# Altium footprint library PFC_Stage.PcbLib: 60 footprints (part 1 of 4)
Each footprint in its own frame and in the unit in brackets; x right, y up, seen from the top. Pads: shape width x height; smd on the part's side, far side on the other; paste and mask are expansions set on the pad; w line width, h text height; cw(c..) or ccw(c..) is an arc to the next point about the centre after c.
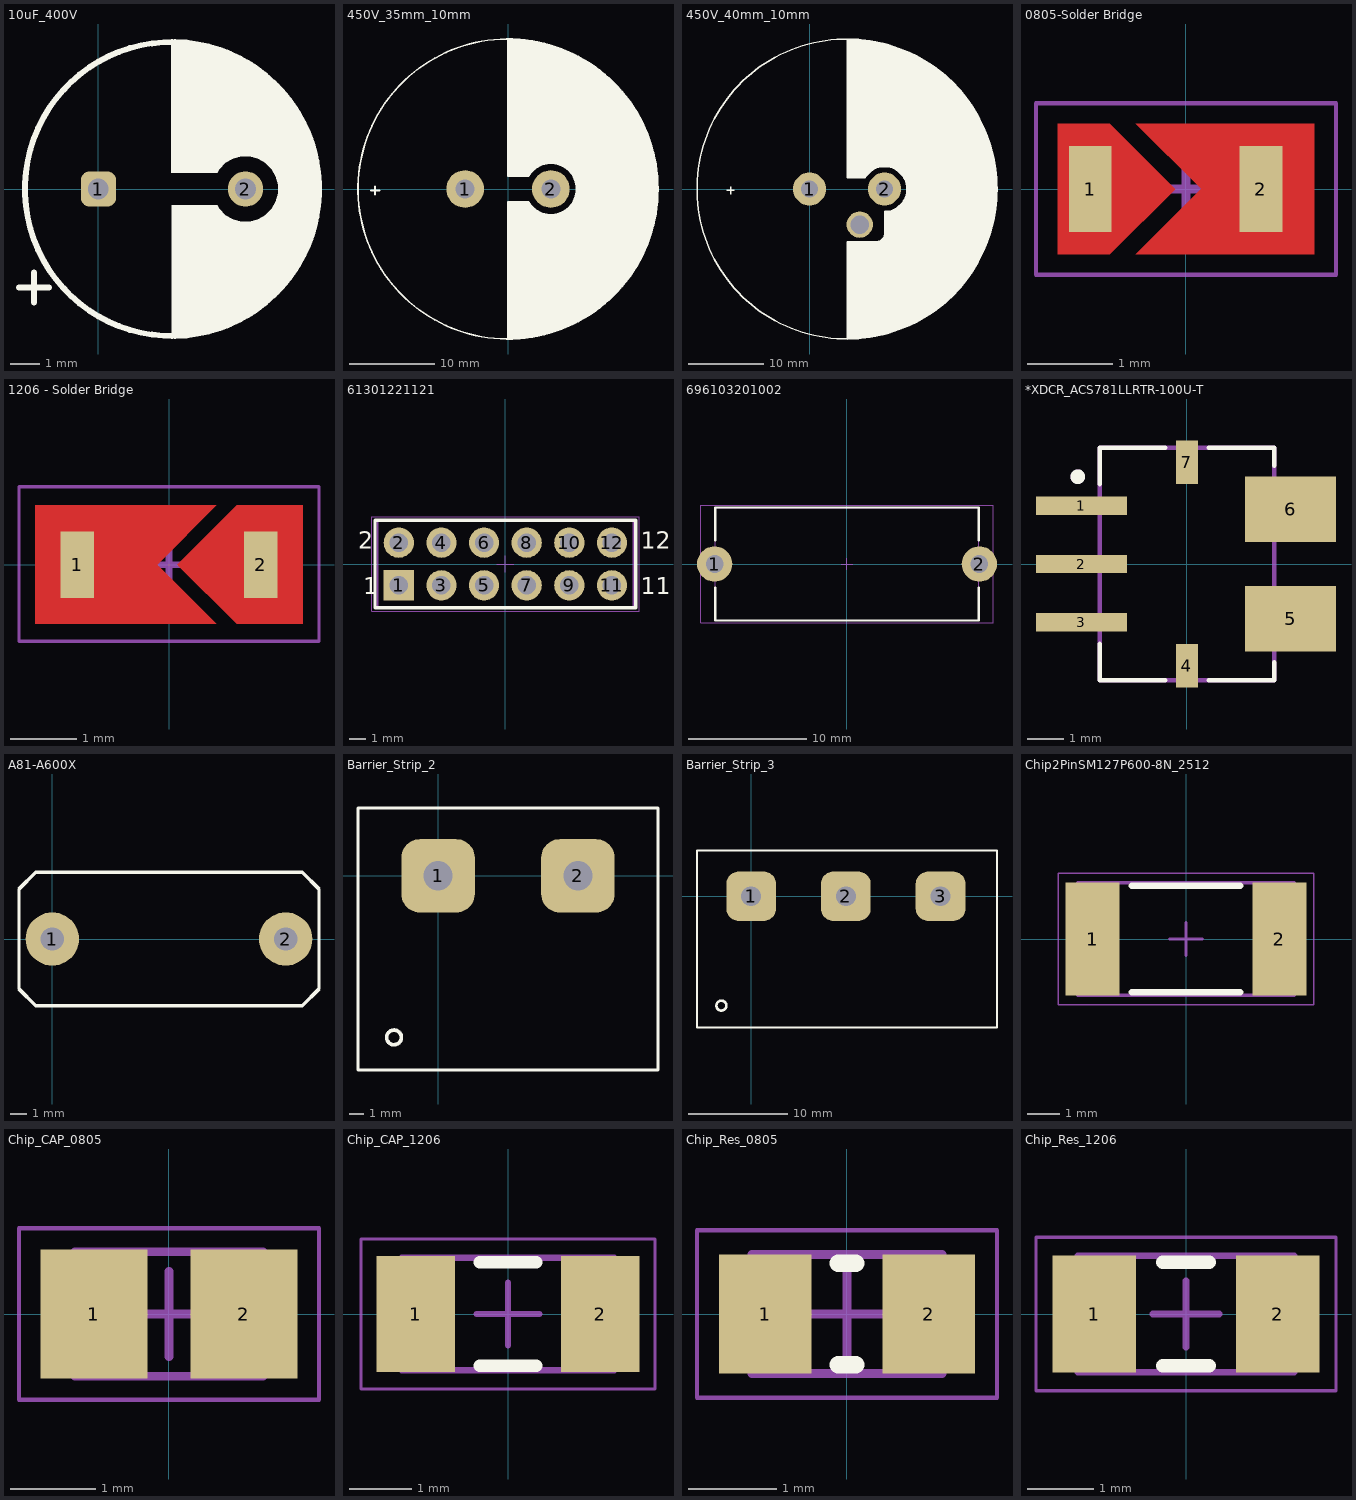
[diagram p0: the footprints below, top view; thin cyan lines are the x and y axes]

## 10uF_400V [mm]
pads (2):
  rrect50% 1.2x1.2 hole 0.7: 1(0,0)
  round 1.2 hole 0.7: 2(5,0)
Top Overlay:
  circle w0.2: c2.5,0 r5
  region: 2.5,-5 2.828,-5 3.478,-4.914 4.111,-4.745 4.716,-4.494 5.284,-4.166 5.804,-3.767 6.267,-3.304 6.666,-2.784 6.994,-2.216 7.245,-1.611 7.414,-0.978 7.5,-0.328 7.5,0.328 7.414,0.978 7.245,1.611 6.994,2.216 6.666,2.784 6.267,3.304 5.804,3.767 5.284,4.166 4.716,4.494 4.111,4.745 3.478,4.914 2.828,5 2.5,5 2.477,4.977 2.477,0.559 4.033,0.559 4.114,0.68 4.32,0.886 4.572,1.032 4.854,1.108 5.146,1.108 5.428,1.032 5.68,0.886 5.886,0.68 6.032,0.428 6.108,0.146 6.108,-0.146 6.032,-0.428 5.886,-0.68 5.68,-0.886 5.428,-1.032 5.146,-1.108 4.854,-1.108 4.572,-1.032 4.32,-0.886 4.114,-0.68 4.033,-0.559 2.5,-0.559
  lines w0.2: -2.702,-3.35 -1.686,-3.35 ; -2.194,-3.858 -2.194,-2.842 ; 2.5,-5 ccw(c2.5,0) 2.5,5
Mechanical 13:
  text "'.Designator'" at -6.328,6.764 h1.52
3D body "CP_Radial_D10.0mm_P5.00mm.step": height 10.5, standoff -1.5, extent -2.5,-4.999 7.5,5

## 450V_35mm_10mm [mm]
pads (2):
  round 4.4 hole 2.2: 1(-5,0) 2(5,0)
Top Overlay:
  circle w0.2: c0,0 r17.5
  region: 0,-17.5 0.625,-17.5 1.872,-17.411 3.109,-17.233 4.331,-16.967 5.53,-16.615 6.701,-16.178 7.838,-15.659 8.936,-15.06 9.987,-14.384 10.988,-13.635 11.933,-12.817 12.817,-11.933 13.635,-10.988 14.384,-9.987 15.06,-8.936 15.659,-7.838 16.178,-6.701 16.615,-5.53 16.967,-4.331 17.233,-3.109 17.411,-1.872 17.5,-0.625 17.5,0.625 17.411,1.872 17.233,3.109 16.967,4.331 16.615,5.53 16.178,6.701 15.659,7.838 15.06,8.936 14.384,9.987 13.635,10.988 12.817,11.933 11.933,12.817 10.988,13.635 9.987,14.384 8.936,15.06 7.838,15.659 6.701,16.178 5.53,16.615 4.331,16.967 3.109,17.233 1.872,17.411 0.625,17.5 0,17.5 0,1.5 2.402,1.5 2.533,1.707 2.844,2.086 3.213,2.41 3.629,2.669 4.082,2.856 4.56,2.968 5.049,3 5.537,2.952 6.011,2.825 6.457,2.622 6.865,2.35 7.223,2.015 7.521,1.626 7.752,1.193 7.91,0.729 7.99,0.245 7.99,-0.245 7.91,-0.729 7.752,-1.193 7.521,-1.626 7.223,-2.015 6.865,-2.35 6.457,-2.622 6.011,-2.825 5.537,-2.952 5.049,-3 4.56,-2.968 4.082,-2.856 3.629,-2.669 3.213,-2.41 2.844,-2.086 2.533,-1.707 2.402,-1.5 0,-1.5
  lines w0.2: -16.018,-0.175 -15.002,-0.175 ; -15.51,-0.683 -15.51,0.333 ; 0,-17.5 ccw(c0,0) 0,17.5 0,1.5 2.402,1.5 cw(c5,0) 2.402,-1.5 0,-1.5 0,-17.5
3D body "35_40_EC.x_t": height 40.5, standoff -2.94, extent -17.502,-17.499 17.516,17.499

## 450V_40mm_10mm [mm]
pads (3):
  round 4.4 hole 2.2: 1(0,0) 2(10,0)
  round 3.5 hole 2.5: ""(6.7,-4.75)
Top Overlay:
  circle w0.2: c5,0 r20
  region: 5,-20 5,-7 9,-7 9.098,-6.995 9.29,-6.957 9.471,-6.882 9.634,-6.773 9.773,-6.634 9.882,-6.471 9.957,-6.29 9.995,-6.098 10,-6 10,-3 10.261,-2.989 10.776,-2.898 11.268,-2.719 11.721,-2.457 12.121,-2.121 12.457,-1.721 12.719,-1.268 12.898,-0.776 12.989,-0.261 12.989,0.261 12.898,0.776 12.719,1.268 12.457,1.721 12.121,2.121 11.721,2.457 11.268,2.719 10.776,2.898 10.261,2.989 9.739,2.989 9.224,2.898 8.732,2.719 8.279,2.457 7.879,2.121 7.543,1.721 7.402,1.5 5,1.5 5,20 5.655,20 6.961,19.914 8.26,19.743 9.544,19.488 10.809,19.149 12.049,18.728 13.259,18.227 14.433,17.648 15.567,16.993 16.656,16.266 17.695,15.468 18.679,14.605 19.605,13.679 20.468,12.695 21.266,11.656 21.993,10.567 22.648,9.433 23.227,8.259 23.728,7.049 24.149,5.809 24.488,4.544 24.743,3.26 24.914,1.961 25,0.655 25,-0.655 24.914,-1.961 24.743,-3.26 24.488,-4.544 24.149,-5.809 23.728,-7.049 23.227,-8.259 22.648,-9.433 21.993,-10.567 21.266,-11.656 20.468,-12.695 19.605,-13.679 18.679,-14.605 17.695,-15.468 16.656,-16.266 15.567,-16.993 14.433,-17.648 13.259,-18.227 12.049,-18.728 10.809,-19.149 9.544,-19.488 8.26,-19.743 6.961,-19.914 5.655,-20
  lines w0.2: -11.018,-0.175 -10.002,-0.175 ; -10.51,-0.683 -10.51,0.333 ; 5,-20 ccw(c5,0) 5,20 5,1.5 7.402,1.5 cw(c10,0) 10,-3 10,-6 cw(c9,-6) 9,-7 5,-7 5,-20
3D body "40mm_EC_CAP.x_t": height 80, standoff -5.59, extent -15,-19.994 25.01,19.995

## 0805-Solder Bridge [mm]
height 1.2
pads (2):
  rect 0.5x1 smd: 1(-1.118,0) 2(0.875,0)
Top Layer:
  region: 0.178,0 -0.584,0.762 1.499,0.762 1.499,-0.762 -0.584,-0.762
  region: -1.499,-0.762 -1.499,0.762 -0.889,0.762 -0.127,0 -0.889,-0.762
Mechanical 13:
  text "'.Designator'" at -1.746,2.762 h1.52
Mechanical 15:
  lines w0.05: -1.75,-1 -1.75,1 1.75,1 1.75,-1 -1.75,-1
  lines w0.1: -0.5,0 0.5,0 ; 0,-0.5 0,0.5

## 1206 - Solder Bridge [mm]
height 0.55
pads (2):
  rect 0.5x1 smd: 1(-1.375,0) 2(1.375,0)
Top Layer:
  region: 0.127,0 1.016,-0.889 2.007,-0.889 2.007,0.889 1.016,0.889
  region: -2.007,-0.889 0.711,-0.889 -0.178,0 0.711,0.889 -2.007,0.889
Mechanical 13:
  text "'.Designator'" at -7.01,-3.48 h1.52
Mechanical 15:
  lines w0.05: -2.25,-1.15 2.25,-1.15 2.25,1.168 -2.25,1.168 -2.25,-1.15
  lines w0.1: -0.5,0 0.5,0 ; 0,-0.5 0,0.5

## 61301221121 [mm] "Pin Header, pitch 2.54 mm, THT, Vertical, dual row, 12p"
height 8.54
pads (12):
  rect 1.8x1.8 hole 1.1: 1(-6.35,-1.27)
  round 1.8 hole 1.1: 2(-6.35,1.27) 3(-3.81,-1.27) 4(-3.81,1.27) 5(-1.27,-1.27) 6(-1.27,1.27) 7(1.27,-1.27) 8(1.27,1.27) 9(3.81,-1.27) 10(3.81,1.27) 11(6.35,-1.27) 12(6.35,1.27)
Top Overlay:
  lines w0.2: -7.77,-2.615 -7.77,2.615 7.77,2.615 7.77,-2.615 -7.77,-2.615
  text "12" at 8.08,0.9 h1.02
  text "11" at 8.08,-1.8 h1.02
  text "1" at -8.48,-1.8 h1.02
  text "2" at -8.78,0.9 h1.02
Mechanical 13:
  lines w0.1: -7.62,-2.54 -7.62,2.54 7.62,2.54 7.62,-2.54 -7.62,-2.54
Mechanical 15:
  lines w0.05: -0.5,0 0.5,0 ; 0,-0.5 0,0.5 ; -7.97,-2.815 7.97,-2.815 7.97,2.815 -7.97,2.815 -7.97,-2.815
3D body "61306428521_Download_STP_61306428521_rev1.x_t": height 36.74, standoff -2.74, extent -7.695,-2.525 7.545,2.555

## 696103201002 [mm] "FUSEHOLDER BLOCKS - PCB - CLIP COVER - THR"
height 12.6
pads (2):
  round 3 hole 1.5: 1(-11.25,0) 2(11.25,0)
Top Overlay:
  lines w0.2: -11.2,-2 -11.2,-4.8 11.2,-4.8 11.2,-2 ; -11.2,2 -11.2,4.8 11.2,4.8 11.2,2
Mechanical 13:
  lines w0.1: -11.2,-4.8 -11.2,4.8 11.2,4.8 11.2,-4.8 -11.2,-4.8
Mechanical 15:
  lines w0.05: -0.5,0 0.5,0 ; 0,-0.5 0,0.5 ; -12.425,-5 -12.425,5 12.425,5 12.425,-5 -12.425,-5
3D body "696103201002.stp": height 11.55, standoff -4.05, extent -12.05,-4.8 12.05,4.8

## *XDCR_ACS781LLRTR-100U-T [mm]
pads (7):
  rect 2.5x0.5 smd: 1(-2.9,1.6) 2(-2.9,0) 3(-2.9,-1.6)
  rect 0.6x1.2 smd: 4(0,-2.8) 7(0,2.8)
  rect 2.5x1.8 smd: 5(2.85,-1.5) 6(2.85,1.5)
Top Overlay:
  circle w0.2: c-3,2.4 r0.1
  lines w0.127: -2.4,-2.2 -2.4,-3.2 -0.6,-3.2 ; -2.4,2.2 -2.4,3.2 -0.6,3.2 ; 0.6,-3.2 2.4,-3.2 2.4,-2.7 ; 0.6,3.2 2.4,3.2 2.4,2.7
Mechanical 4:
  circle w0.2: c-3,2.4 r0.1
  circle w0.2: c-3,2.4 r0.1
  lines w0.127: -2.4,-3.2 2.4,-3.2 ; -2.4,-3.2 -2.4,3.2 ; -2.4,-3.2 2.4,-3.2 ; -2.4,-3.2 -2.4,3.2 ; -2.4,3.2 2.4,3.2 ; -2.4,3.2 2.4,3.2 ; 2.4,-3.2 2.4,3.2 ; 2.4,-3.2 2.4,3.2
3D body "ACS781LLRTR-100B-T--3DModel-STEP-56544.STEP": height 1.58, standoff -0.02, extent -3.2,-3.2 3.2,3.2

## A81-A600X [mm]
pads (2):
  round 3.2 hole 1.4: 1(0,0) 2(14,0)
Top Overlay:
  lines w0.2: -2,-3 -2,3 -1,4 0,4 15,4 16,3 16,-3 15,-4 -1,-4 -2,-3
3D body "BOURNS - 2045_2-PIN_v1.x_t": height 8, standoff -7, extent -0.397,-4 14.4,4

## Barrier_Strip_2 [mm]
pads (2):
  rrect50% 5x5 hole 2: 1(0,0) 2(9.525,0)
Top Overlay:
  circle w0.254: c-3,-11 r0.5
  lines w0.2: -5.45,-13.225 14.975,-13.225 14.975,4.625 -5.45,4.625 -5.45,-13.225
3D body "c-3-1437652-9-p-3d.x_t": height 16.76, standoff -4.19, extent -5.4,-13.13 15.2,4.65

## Barrier_Strip_3 [mm]
pads (3):
  rrect50% 5x5 hole 2: 1(0,0) 2(9.525,0) 3(19.05,0)
Top Overlay:
  circle w0.254: c-3,-11 r0.5
  lines w0.2: -5.45,-13.225 -5.45,4.625 24.725,4.625 24.725,-13.225 -5.45,-13.225
3D body "c-5-1437652-4-p-3d.x_t": height 16.76, standoff -4.19, extent -5.549,-13.115 24.575,4.665

## Chip2PinSM127P600-8N_2512 [mm]
height 0.8
pads (2):
  rect 1.65x3.45 smd: 1(-2.85,0) 2(2.85,0)
Top Overlay:
  lines w0.2: -1.65,-1.625 1.65,-1.625 ; -1.65,1.625 1.65,1.625
Mechanical 13:
  lines w0.1: -3.3,-1.715 3.3,-1.715 3.3,1.715 -3.3,1.715 -3.3,-1.715
Mechanical 15:
  lines w0.05: -3.9,-2 3.9,-2 3.9,2 -3.9,2 -3.9,-2
  lines w0.1: -0.5,0 0.5,0 ; 0,-0.5 0,0.5
3D body "Chip2PinSM127P600-8N_2512.step": height 0.8, standoff 0, extent -3.3,-1.715 3.3,1.715

## Chip_CAP_0805 [mm]
height 1.2
pads (2):
  rect 1.25x1.5 smd: 1(-0.875,0) 2(0.875,0)
Mechanical 13:
  lines w0.1: -1.1,-0.725 1.1,-0.725 1.1,0.725 -1.1,0.725 -1.1,-0.725
  text "'.Designator'" at -4.642,1.732 h1.52
Mechanical 15:
  lines w0.05: -1.75,-1 1.75,-1 1.75,1 -1.75,1 -1.75,-1
  lines w0.1: -0.5,0 0.5,0 ; 0,-0.5 0,0.5
3D body "Chip_CAP_0805.step": height 1.2, standoff 0, extent -1.1,-0.725 1.1,0.725

## Chip_CAP_1206 [mm]
height 1.4
pads (2):
  rect 1.25x1.85 smd: 1(-1.475,0) 2(1.475,0)
Top Overlay:
  lines w0.2: -0.45,-0.825 0.45,-0.825 ; -0.45,0.825 0.45,0.825
Mechanical 13:
  lines w0.1: -1.7,-0.9 1.7,-0.9 1.7,0.9 -1.7,0.9 -1.7,-0.9
  text "'.Designator'" at -6.166,2.24 h1.52
Mechanical 15:
  lines w0.05: -2.35,-1.2 2.35,-1.2 2.35,1.2 -2.35,1.2 -2.35,-1.2
  lines w0.1: -0.5,0 0.5,0 ; 0,-0.5 0,0.5
3D body "Chip_CAP_1206.step": height 1.4, standoff 0, extent -1.7,-0.9 1.7,0.9

## Chip_Res_0805 [mm]
height 0.5
pads (2):
  rect 1.05x1.35 smd: 1(-0.925,0) 2(0.925,0)
Top Overlay:
  lines w0.2: -0.1,-0.575 0.1,-0.575 ; -0.1,0.575 0.1,0.575
Mechanical 13:
  lines w0.1: -1.075,-0.675 -1.075,0.675 1.075,0.675 1.075,-0.675 -1.075,-0.675
  text "'.Designator'" at -5.404,-2.84 h1.52
Mechanical 15:
  lines w0.05: -1.7,-0.95 -1.7,0.95 1.7,0.95 1.7,-0.95 -1.7,-0.95
  lines w0.1: -0.5,0 0.5,0 ; 0,-0.5 0,0.5
3D body "Chip_Res_0805.step": height 0.5, standoff 0, extent -1.075,-0.675 1.075,0.675

## Chip_Res_1206 [mm]
height 0.55
pads (2):
  rect 1.25x1.75 smd: 1(-1.375,0) 2(1.375,0)
Top Overlay:
  lines w0.2: -0.35,-0.775 0.35,-0.775 ; -0.35,0.775 0.35,0.775
Mechanical 13:
  lines w0.1: -1.625,-0.875 -1.625,0.875 1.625,0.875 1.625,-0.875 -1.625,-0.875
  text "'.Designator'" at -6.604,-3.048 h1.52
Mechanical 15:
  lines w0.05: -2.25,-1.15 -2.25,1.15 2.25,1.15 2.25,-1.15 -2.25,-1.15
  lines w0.1: -0.5,0 0.5,0 ; 0,-0.5 0,0.5
3D body "Chip_Res_1206.step": height 0.55, standoff 0, extent -1.625,-0.875 1.625,0.875